# Altium schematic symbol library JL_SCH.SchLib: 1185 symbols (part 6 of 6)
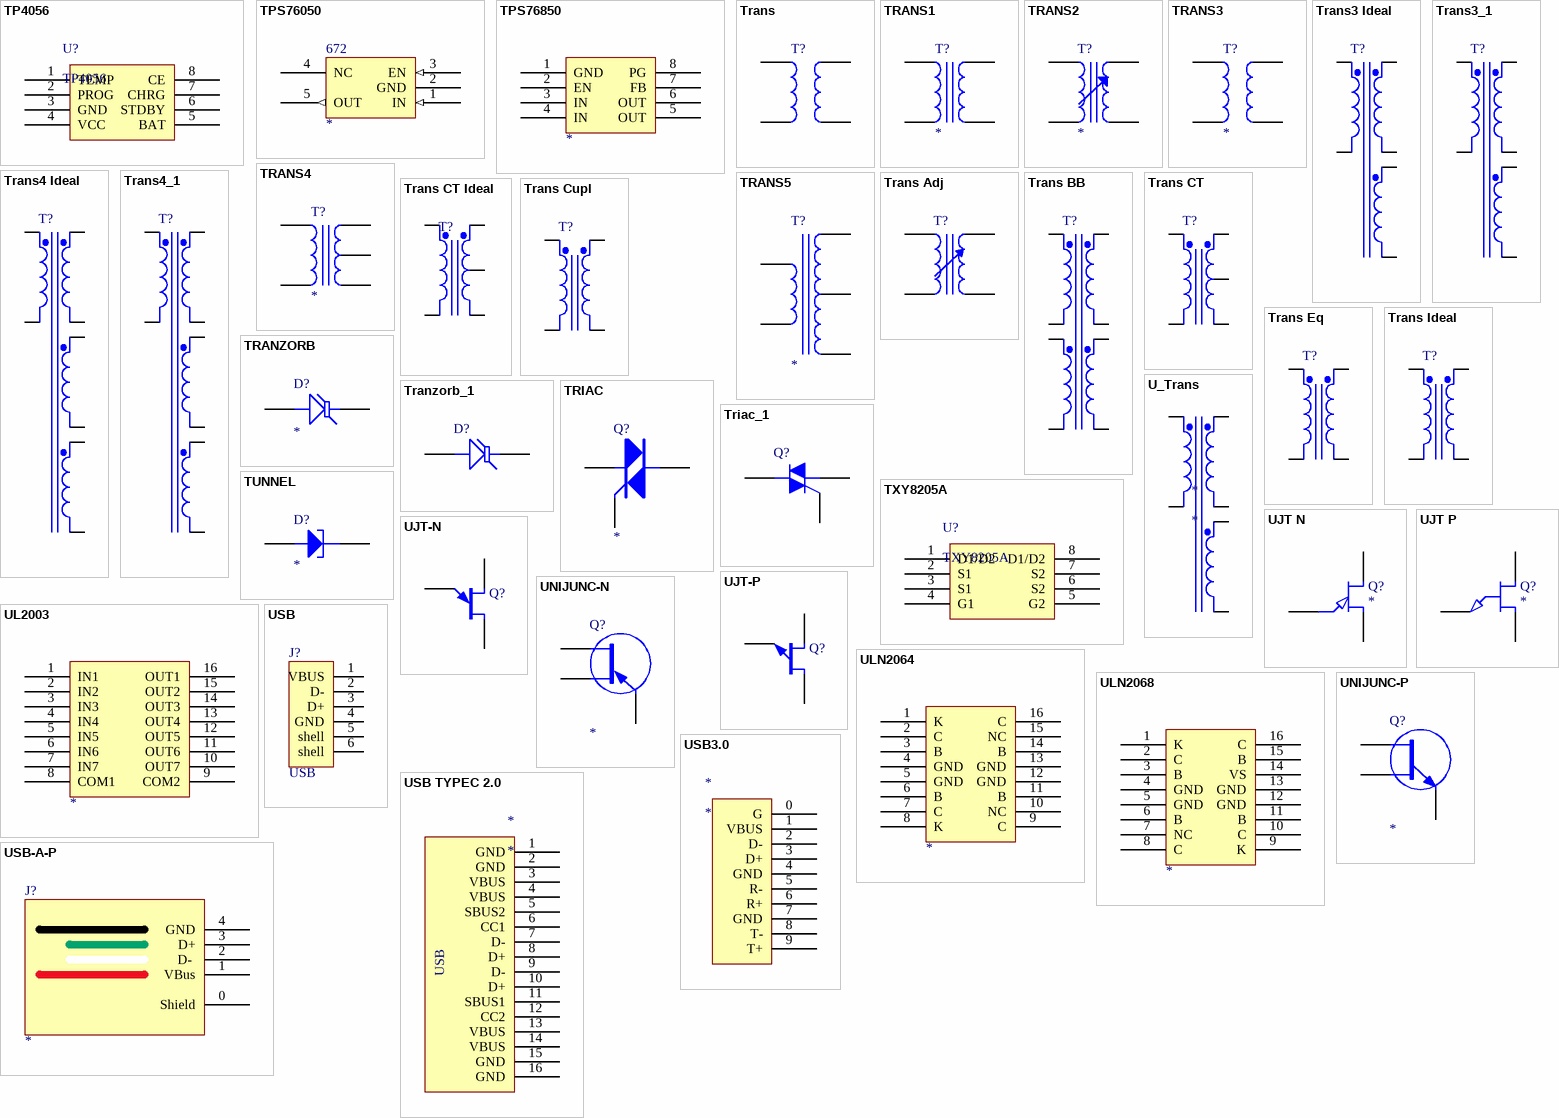
[diagram p43: symbols TP4056 to USB-A-P]

## ULN2064
designator ?
pins: 1 K, 2 C, 3 B, 4 GND, 5 GND, 6 B, 7 C, 8 K, 9 C, 10 NC, 11 B, 12 GND, 13 GND, 14 B, 15 NC, 16 C

## ULN2068
designator ?
pins: 1 K, 2 C, 3 B, 4 GND, 5 GND, 6 B, 7 NC, 8 C, 9 K, 10 C, 11 B, 12 GND, 13 GND, 14 VS, 15 B, 16 C

## UNIJUNC-N
designator Q?
pins: 1 B1, 2 B2, 3 E

## UNIJUNC-P
designator Q?
pins: 1 B1, 2 B2, 3 E

## USB
designator J?
footprint USB-A
pins: 1 VBUS, 2 D-, 3 D+, 4 GND, 5 shell, 6 shell

## USB3.0
designator *
footprint USB-B-R
pins: 0 G, 1 VBUS, 2 D-, 3 D+, 4 GND, 5 R-, 6 R+, 7 GND, 8 T-, 9 T+

## USB TYPEC 2.0
designator *
footprint USB_TYPE-C_16P
pins: 1 GND, 2 GND, 3 VBUS, 4 VBUS, 5 SBUS2, 6 CC1, 7 D-, 8 D+, 9 D-, 10 D+, 11 SBUS1, 12 CC2, 13 VBUS, 14 VBUS, 15 GND, 16 GND
text: USB

## USB-A-P
designator J?
USB-A 插头
footprint USB-A-P
pins: 0 Shield, 1 VBus, 2 D- , 3 D+, 4 GND

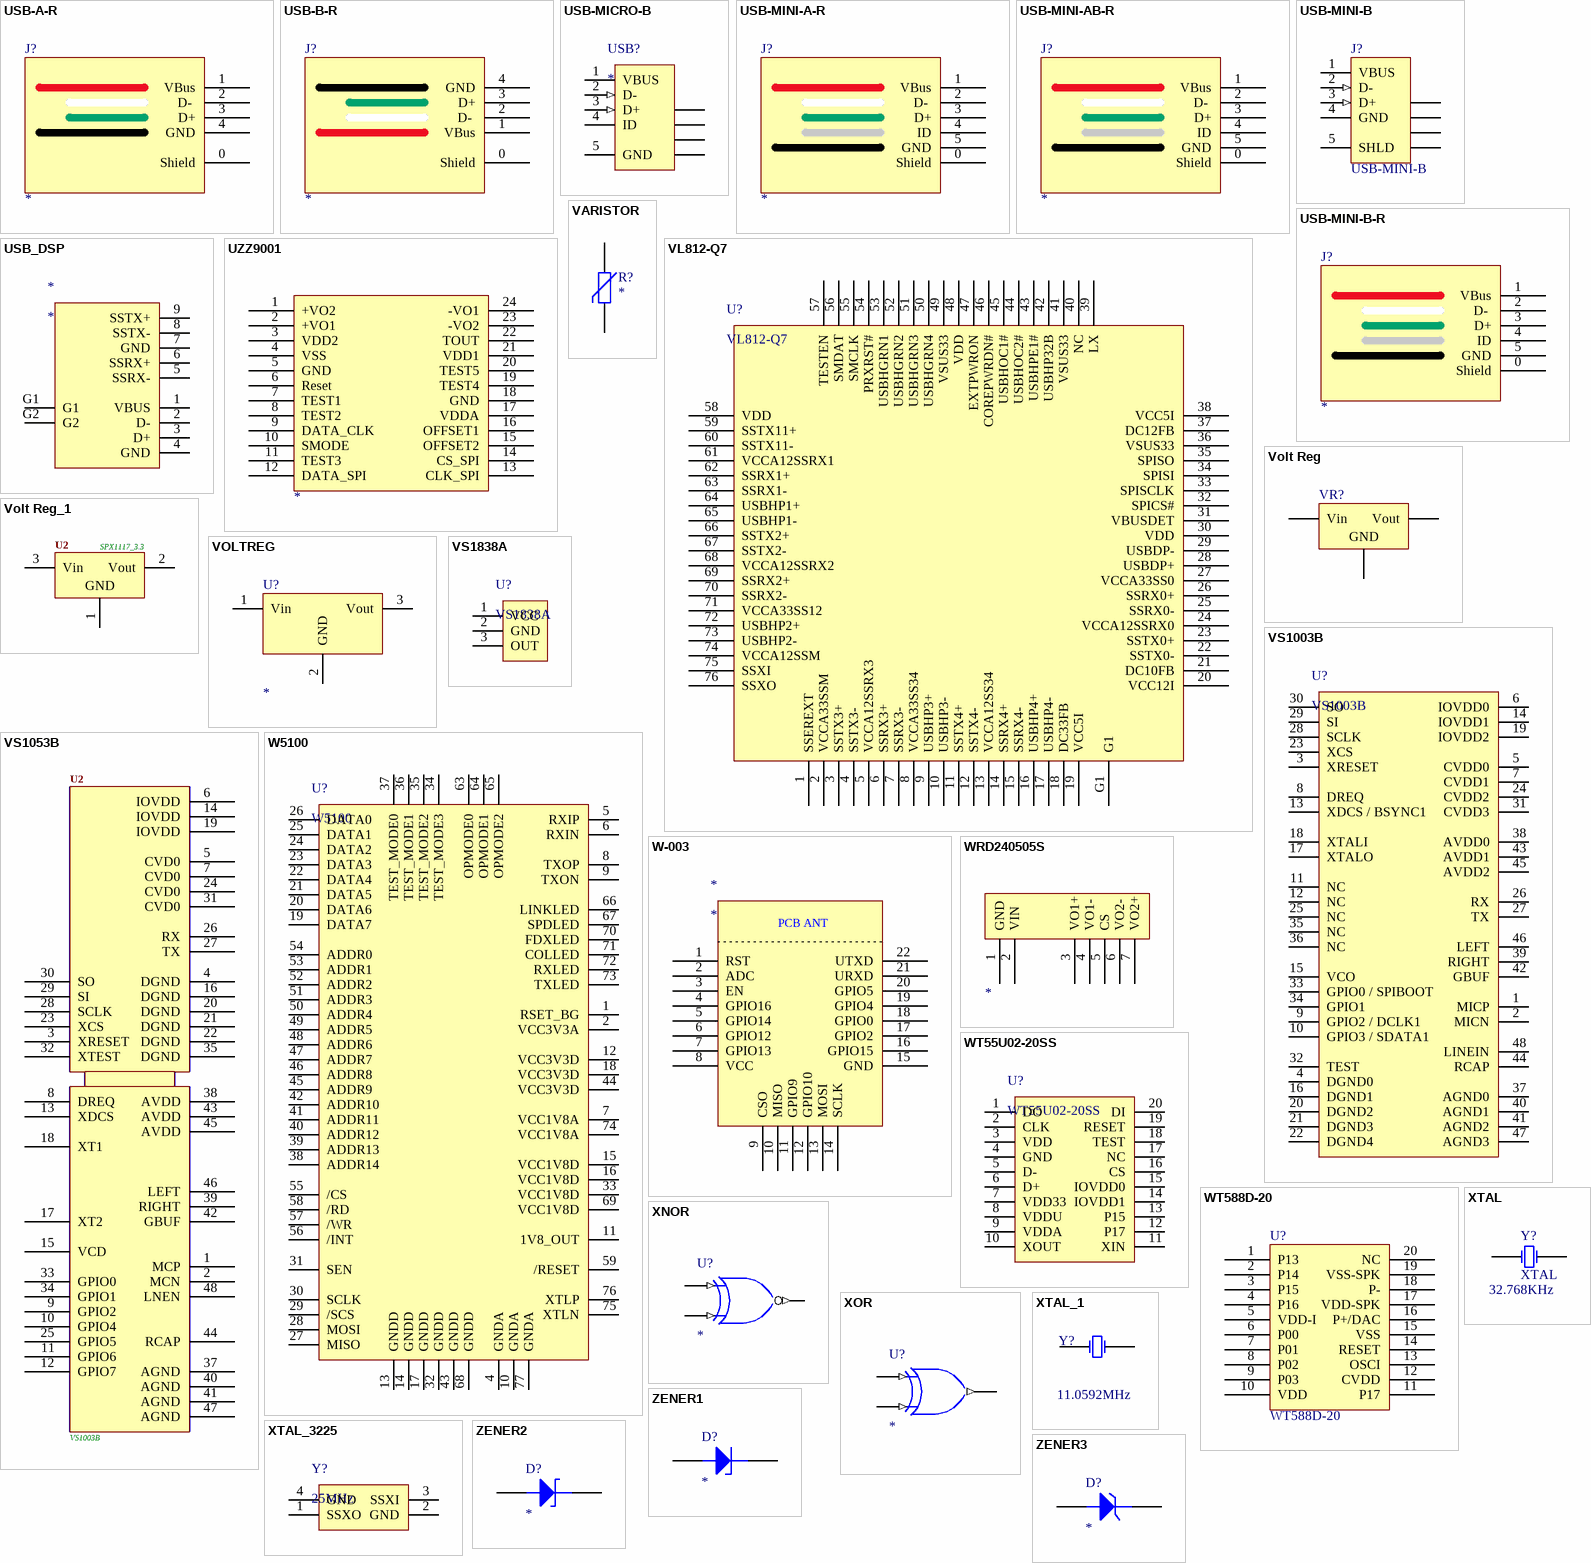
[diagram p37: symbols USB-A-R to ZENER3]

## USB-A-R
designator J?
USB-A 插座
footprint USB-A-R
pins: 0 Shield, 1 VBus, 2 D- , 3 D+, 4 GND

## USB-B-R
designator J?
USB-B 插座
footprint USB-B-R
pins: 0 Shield, 1 VBus, 2 D- , 3 D+, 4 GND

## USB-MICRO-B
designator USB?
footprint USB-MICRO-B (Connector; USB2.0, Type A, SM; 5 Position; Right Angle)
pins: 1 VBUS (power) "Power", 2 D- (in) "-DATA", 3 D+ (in) "+DATA", 4 ID (power) "Ground", 5 GND "Shield", 6 SHLD "Shield", 7 SHLD "Shield", 8 SHLD "Shield", 9 SHLD "Shield"

## USB-MINI-A-R
designator J?
USB-MINI-A 插座
footprint USB-MINI-R
pins: 0 Shield, 1 VBus, 2 D- , 3 D+, 4 ID, 5 GND

## USB-MINI-AB-R
designator J?
USB-MINI-AB 插座
footprint USB-MINI-R
pins: 0 Shield, 1 VBus, 2 D- , 3 D+, 4 ID, 5 GND

## USB-MINI-B
designator J?
USB 2.0, Right Angle, SMT, A Type, Receptacle, 5 Position, Black; ContactMaterial: Phosphor Bronze; ContactPlating: Gold (30) over Nickel; PCB_Layout: Complies with manufacturer's recommendation.; DrillSize: Corresponds to nominal value.; PanelGround: Without; Published: 15-Jul-2004; DatasheetDocument: 15-Nov-2002; PackageDocument: 15-Nov-2002; PackageReference: 440478; Publisher: Altium Limited; HousingMaterial: Thermoplastic; ComponentLink1Description: Manufacturer Link; ComponentLink1URL: http://www.tycoelectronics.com/; ComponentLink2Description: Packaging Specification; ComponentLink2URL: http://ecommas.tycoelectronics.com/commerce/DocumentDelivery/DDEController?Action=showdoc&DocId=Customer+Drawing%7F440478%7FB%7Fpdf%7FEnglish%7FC_440478_B.pdf
footprint USB-MINI-B (Connector; USB2.0, Type A, SM; 5 Position; Right Angle)
pins: 1 VBUS (power) "Power", 2 D- (in) "-DATA", 3 D+ (in) "+DATA", 4 GND (power) "Ground", 5 SHLD "Shield", 6 SHLD "Shield", 7 SHLD "Shield", 8 SHLD "Shield", 9 SHLD "Shield"

## USB-MINI-B-R
designator J?
USB-MINI-B 插座
footprint USB-MINI-R
pins: 0 Shield, 1 VBus, 2 D- , 3 D+, 4 ID, 5 GND

## USB_DSP
designator *
footprint USB3.0-A
pins: 1 VBUS, 2 D-, 3 D+, 4 GND, 5 SSRX-, 6 SSRX+, 7 GND, 8 SSTX-, 9 SSTX+, G1, G2

## UZZ9001
designator ?
pins: 1 +VO2, 2 +VO1, 3 VDD2, 4 VSS, 5 GND, 6 Reset, 7 TEST1, 8 TEST2, 9 DATA_CLK, 10 SMODE, 11 TEST3, 12 DATA_SPI, 13 CLK_SPI, 14 CS_SPI, 15 OFFSET2, 16 OFFSET1, 17 VDDA, 18 GND, 19 TEST4, 20 TEST5, 21 VDD1, 22 TOUT, 23 -VO2, 24 -VO1

## VARISTOR
designator R?
pins: 1, 2

## VL812-Q7
designator U?
footprint QFN76 (Footprint not found)
footprint QFN76
pins: 1 SSEREXT, 2 VCCA33SSM, 3 SSTX3+, 4 SSTX3-, 5 VCCA12SSRX3, 6 SSRX3+, 7 SSRX3-, 8 VCCA33SS34, 9 USBHP3+, 10 USBHP3-, 11 SSTX4+, 12 SSTX4-, 13 VCCA12SS34, 14 SSRX4+, 15 SSRX4-, 16 USBHP4+, 17 USBHP4-, 18 DC33FB, 19 VCC5I, 20 VCC12I, 21 DC10FB, 22 SSTX0-, 23 SSTX0+, 24 VCCA12SSRX0, 25 SSRX0-, 26 SSRX0+, 27 VCCA33SS0, 28 USBDP+, 29 USBDP-, 30 VDD, 31 VBUSDET, 32 SPICS#, 33 SPISCLK, 34 SPISI, 35 SPISO, 36 VSUS33, 37 DC12FB, 38 VCC5I, 39 LX, 40 NC, 41 VSUS33, 42 USBHP32B, 43 USBHPE1#, 44 USBHOC2#, 45 USBHOC1#, 46 COREPWRDN#, 47 EXTPWRON, 48 VDD, 49 VSUS33, 50 USBHGRN4, 51 USBHGRN3, 52 USBHGRN2, 53 USBHGRN1, 54 PRXRST#, 55 SMCLK, 56 SMDAT, 57 TESTEN, 58 VDD, 59 SSTX11+, 60 SSTX11-, 61 VCCA12SSRX1, 62 SSRX1+, 63 SSRX1-, 64 USBHP1+, 65 USBHP1-, 66 SSTX2+, 67 SSTX2-, 68 VCCA12SSRX2, 69 SSRX2+, 70 SSRX2-, 71 VCCA33SS12, 72 USBHP2+, 73 USBHP2-, 74 VCCA12SSM, 75 SSXI, 76 SSXO, G1

## Volt Reg
designator VR?
Voltage Regulator; Published: 24-Mar-1999; LatestRevisionDate: 29-May-2009; LatestRevisionNote: IPC-7351 Footprint Added.; PackageReference: D2PAK; Publisher: Altium Limited; PackageDescription: 3-Pin Transistor Outline Package 2.54 mm Pitch, 15.1 mm Lead Span
footprint TO254P1510-3_4N (D2-PAK, 4-Leads, Body 8.8x10.4mm, Pitch 2.54mm, Lead Span 15.1mm, IPC Medium Density)
footprint TO254P1510-3_4L (D2-PAK, 4-Leads, Body 8.8x10.4mm, Pitch 2.54mm, Lead Span 15.1mm, IPC High Density)
footprint TO254P1510-3_4M (D2-PAK, 4-Leads, Body 8.8x10.4mm, Pitch 2.54mm, Lead Span 15.1mm, IPC Low Density)
pins: 1 Vin, 2 GND, 3 Vout

## Volt Reg_1
designator U2, comment SPX1117_3.3
Voltage Regulator; Manufacturer: Generic Components; Class: Power Management; Published: 1999; SubClass: Voltage Regulator
footprint SIP-G3/Y2 (SMD-220)
footprint SOT-223
pins: 1 GND, 2 Vout, 3 Vin

## VOLTREG
designator U?
footprint TO220H
pins: 1 Vin, 2 GND, 3 Vout

## VS1003B
designator U?
footprint LQFP-48
pins: 1 MICP, 2 MICN, 3 XRESET, 4 DGND0, 5 CVDD0, 6 IOVDD0, 7 CVDD1, 8 DREQ, 9 GPIO2 / DCLK1, 10 GPIO3 / SDATA1, 11 NC, 12 NC, 13 XDCS / BSYNC1, 14 IOVDD1, 15 VCO, 16 DGND1, 17 XTALO, 18 XTALI, 19 IOVDD2, 20 DGND2, 21 DGND3, 22 DGND4, 23 XCS, 24 CVDD2, 25 NC, 26 RX, 27 TX, 28 SCLK, 29 SI, 30 SO, 31 CVDD3, 32 TEST, 33 GPIO0 / SPIBOOT, 34 GPIO1, 35 NC, 36 NC, 37 AGND0, 38 AVDD0, 39 RIGHT, 40 AGND1, 41 AGND2, 42 GBUF, 43 AVDD1, 44 RCAP, 45 AVDD2, 46 LEFT, 47 AGND3, 48 LINEIN

## VS1053B
designator U2, comment VS1003B
footprint LQFP-48
pins: 1 MCP, 2 MCN, 3 XRESET, 4 DGND, 5 CVD0, 6 IOVDD, 7 CVD0, 8 DREQ, 9 GPIO2, 10 GPIO4, 11 GPIO6, 12 GPIO7, 13 XDCS, 14 IOVDD, 15 VCD, 16 DGND, 17 XT2, 18 XT1, 19 IOVDD, 20 DGND, 21 DGND, 22 DGND, 23 XCS, 24 CVD0, 25 GPIO5, 26 RX, 27 TX, 28 SCLK, 29 SI, 30 SO, 31 CVD0, 32 XTEST, 33 GPIO0, 34 GPIO1, 35 DGND, 37 AGND, 38 AVDD, 39 RIGHT, 40 AGND, 41 AGND, 42 GBUF, 43 AVDD, 44 RCAP, 45 AVDD, 46 LEFT, 47 AGND, 48 LNEN

## VS1838A
designator U?
footprint REDRSV
pins: 1 VCC, 2 GND, 3 OUT

## W5100
designator U?
footprint LQFP-80 (TSQFP, 80-Leads, Body 14.0x14.0mm (max), Pitch 0.50mm, IPC Medium Density)
pins: 1 RSET_BG, 2 VCC3V3A, 4 GNDA, 5 RXIP, 6 RXIN, 7 VCC1V8A, 8 TXOP, 9 TXON, 10 GNDA, 11 1V8_OUT, 12 VCC3V3D, 13 GNDD, 14 GNDD, 15 VCC1V8D, 16 VCC1V8D, 17 GNDD, 18 VCC3V3D, 19 DATA7, 20 DATA6, 21 DATA5, 22 DATA4, 23 DATA3, 24 DATA2, 25 DATA1, 26 DATA0, 27 MISO, 28 MOSI, 29 /SCS, 30 SCLK, 31 SEN, 32 GNDD, 33 VCC1V8D, 34 TEST_MODE3, 35 TEST_MODE2, 36 TEST_MODE1, 37 TEST_MODE0, 38 ADDR14, 39 ADDR13, 40 ADDR12, 41 ADDR11, 42 ADDR10, 43 GNDD, 44 VCC3V3D, 45 ADDR9, 46 ADDR8, 47 ADDR7, 48 ADDR6, 49 ADDR5, 50 ADDR4, 51 ADDR3, 52 ADDR2, 53 ADDR1, 54 ADDR0, 55 /CS, 56 /INT, 57 /WR, 58 /RD, 59 /RESET, 63 OPMODE0, 64 OPMODE1, 65 OPMODE2, 66 LINKLED, 67 SPDLED, 68 GNDD, 69 VCC1V8D, 70 FDXLED, 71 COLLED, 72 RXLED, 73 TXLED, 74 VCC1V8A, 75 XTLN, 76 XTLP, 77 GNDA

## W-003
designator *
pins: 1 RST, 2 ADC, 3 EN, 4 GPIO16, 5 GPIO14, 6 GPIO12, 7 GPIO13, 8 VCC, 9 CSO, 10 MISO, 11 GPIO9, 12 GPIO10, 13 MOSI, 14 SCLK, 15 GND, 16 GPIO15, 17 GPIO2, 18 GPIO0, 19 GPIO4, 20 GPIO5, 21 URXD, 22 UTXD
text: PCB ANT

## WRD240505S
designator ?
pins: 1 GND, 2 VIN, 3 VO1+, 4 VO1-, 5 CS, 6 VO2-, 7 VO2+

## WT55U02-20SS
designator U?
footprint SSOP20W
pins: 1 DO, 2 CLK, 3 VDD, 4 GND, 5 D-, 6 D+, 7 VDD33, 8 VDDU, 9 VDDA, 10 XOUT, 11 XIN, 12 P17, 13 P15, 14 IOVDD1, 15 IOVDD0, 16 CS, 17 NC, 18 TEST, 19 RESET, 20 DI

## WT588D-20
designator U?
footprint SSOP20W
pins: 1 P13, 2 P14, 3 P15, 4 P16, 5 VDD-I, 6 P00, 7 P01, 8 P02, 9 P03, 10 VDD, 11 P17, 12 CVDD, 13 OSCI, 14 RESET, 15 VSS, 16 P+/DAC, 17 VDD-SPK, 18 P-, 19 VSS-SPK, 20 NC

## XNOR
designator U?
XNOR Gate
pins: 1 A (in), 2 B (in), 3 Y (out)

## XOR
designator U?
XOR Gate
pins: 1 A (in), 2 B (in), 3 Y (out)

## XTAL
designator Y?  value 32.768KHz
Crystal Oscillator; Published: 8-Jun-2000; LatestRevisionDate: 17-Jul-2002; LatestRevisionNote: Re-released for DXP Platform.; PackageReference: R38; Publisher: Altium Limited
footprint BCY-W2/D3.1 (Crystal, Thru-Hole; 2 Leads; Body 3.1 x 8.2 mm (Dia.xH))
simulation model XTAL (Spice Subcircuit)
pins: 1 OSC1, 2 OSC2

## XTAL_1
designator Y?, comment 11.0592MHz
Crystal Oscillator; Published: 8-Jun-2000; LatestRevisionDate: 17-Jul-2002; LatestRevisionNote: Re-released for DXP Platform.; PackageReference: R38; Publisher: Altium Limited; Value: 11.0592MHz
footprint XTAL (Radial Cap, Thru-Hole; 2 Leads; 0.2 in Pin Spacing)
pins: 1 OSC1, 2 OSC2

## XTAL_3225
designator Y?, comment 25MHz
footprint X3225
pins: 1 SSXO, 2 GND, 3 SSXI, 4 GND

## ZENER1
designator D?
Zener Diode
pins: 1 A, 2 K

## ZENER2
designator D?
Zener Diode
pins: 1 A, 2 K

## ZENER3
designator D?
Zener Diode
pins: 1 A, 2 K

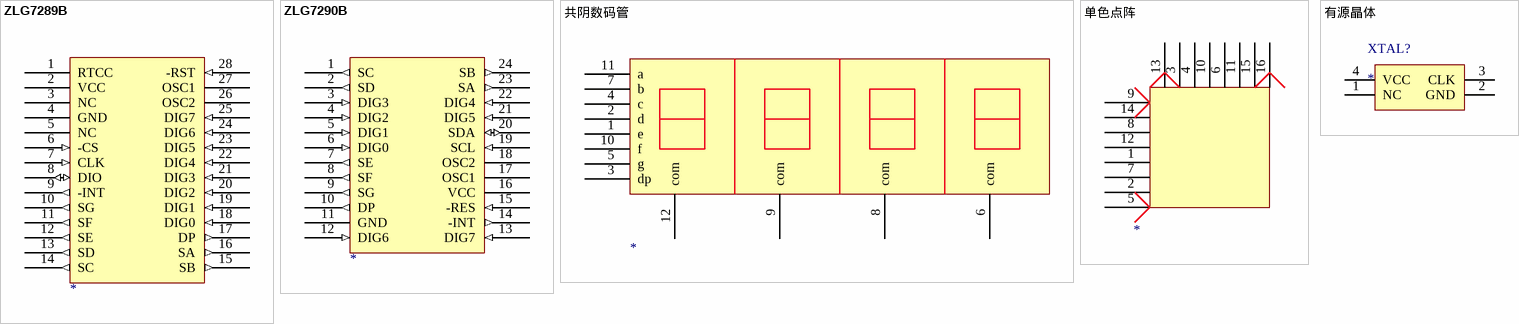
[diagram p38: symbols ZLG7289B to 有源晶体]

## ZLG7289B
designator ?
pins: 1 RTCC, 2 VCC (power), 3 NC, 4 GND (power), 5 NC, 6 -CS (in), 7 CLK (in), 8 DIO (io), 9 -INT (out), 10 SG (out), 11 SF (out), 12 SE (out), 13 SD (out), 14 SC (out), 15 SB (out), 16 SA (out), 17 DP (out), 18 DIG0 (in), 19 DIG1 (in), 20 DIG2 (in), 21 DIG3 (in), 22 DIG4 (in), 23 DIG5 (in), 24 DIG6 (in), 25 DIG7 (in), 26 OSC2 (hiz), 27 OSC1 (hiz), 28 -RST (in)

## ZLG7290B
designator ?
pins: 1 SC (out), 2 SD (out), 3 DIG3 (in), 4 DIG2 (in), 5 DIG1 (in), 6 DIG0 (in), 7 SE (out), 8 SF (out), 9 SG (out), 10 DP (out), 11 GND (power), 12 DIG6 (in), 13 DIG7 (in), 14 -INT (out), 15 -RES (in), 16 VCC (power), 17 OSC1 (hiz), 18 OSC2 (hiz), 19 SCL (in), 20 SDA (io), 21 DIG5 (in), 22 DIG4 (in), 23 SA (out), 24 SB (out)

## 共阴数码管
designator ?
footprint SR430402K
pins: 1 e, 2 d, 3 dp, 4 c, 5 g, 6 com, 7 b, 8 com, 9 com, 10 f, 11 a, 12 com

## 单色点阵
designator ?
pins: 1, 2, 3, 4, 5, 6, 7, 8, 9, 10, 11, 12, 13, 14, 15, 16

## 有源晶体
designator XTAL?
footprint 贴片有源晶体
pins: 1 NC, 2 GND, 3 CLK, 4 VCC